# Altium schematic symbol library FPGA_Xilinx_Virtex7.SchLib: 34 symbols (part 33 of 34) (continued)
## XC7VX1140T-FLG1928 (continued)
part S pins: AA12 DONE_0 (io), AB13 PROGRAM_B_0 (io), AB22 VREFN_0 (io), AB23 VP_0 (io), AB33 CCLK_0 (io), AC12 CFGBVS_0 (io), AC22 VN_0 (io), AC23 VREFP_0 (io), AD22 DXN_0 (io), AD23 DXP_0 (io), AD33 TDO_0 (io), AE12 M2_0 (io), AE32 TCK_0 (io), AF13 M1_0 (io), AF33 TMS_0 (io), AG12 M0_0 (io), AG32 TDI_0 (io), V33 VCCO_0 (power), W12 INIT_B_0 (io), Y33 VCCO_0 (power)
part T pins: A3 GND (power), A4 GND (power), A7 GND (power), A8 GND (power), A11 GND (power), A12 GND (power), A13 GND (power), A22 GND (power), A32 GND (power), A33 GND (power), A34 GND (power), A37 GND (power), A38 GND (power), A41 GND (power), A42 GND (power), AA13 VCCINT (power), AA15 VCCINT (power), AA17 VCCINT (power), AA19 VCCAUX_IO_G3 (power), AA21 VCCINT (power), AA22 GNDADC (power), AA23 VCCADC (power), AA25 VCCBRAM (power), AA27 VCCAUX (power), AA29 VCCINT (power), AA31 VCCINT (power), AA32 VCCBATT_0 (power), AA33 VCCINT (power), AB12 VCCINT (power), AB14 VCCINT (power), AB16 VCCINT (power), AB18 VCCAUX (power), AB20 VCCINT (power), AB24 VCCBRAM (power), AB26 VCCBRAM (power), AB28 VCCINT (power), AB30 VCCINT (power), AB32 VCCINT (power), AC13 VCCINT (power), AC15 VCCINT (power), AC17 VCCINT (power), AC19 VCCAUX_IO_G2 (power), AC21 VCCINT (power), AC25 VCCBRAM (power), AC27 VCCAUX (power), AC29 VCCINT (power), AC31 VCCINT (power), AC33 VCCINT (power), AD12 VCCINT (power), AD14 VCCINT (power), AD16 VCCINT (power), AD18 VCCAUX (power), AD20 VCCINT (power), AD24 VCCBRAM (power), AD26 VCCAUX_IO_G0 (power), AD28 VCCINT (power), AD30 VCCINT (power), AD32 VCCINT (power), AE13 VCCINT (power), AE15 VCCINT (power), AE17 VCCINT (power), AE19 VCCAUX_IO_G2 (power), AE21 VCCINT (power), AE23 VCCINT (power), AE25 VCCBRAM (power), AE27 VCCAUX (power), AE29 VCCINT (power), AE31 VCCINT (power), AE33 VCCINT (power), AF12 VCCINT (power), AF14 VCCINT (power), AF16 VCCINT (power), AF18 VCCAUX (power), AF20 VCCINT (power), AF22 VCCINT (power), AF24 VCCINT (power), AF26 VCCAUX_IO_G0 (power), AF28 VCCINT (power), AF30 VCCINT (power), AF32 VCCINT (power), AG13 VCCINT (power), AG15 VCCINT (power), AG17 VCCINT (power), AG19 VCCAUX_IO_G2 (power), AG21 VCCINT (power), AG23 VCCINT (power), AG25 VCCBRAM (power), AG27 VCCINT (power), AG29 VCCINT (power), AG31 VCCINT (power), AG33 VCCINT (power), AH12 VCCINT (power), AH32 VCCINT (power), B2 GND (power), B5 GND (power), B9 GND (power), B13 GND (power), B19 GND (power), B29 GND (power), B32 GND (power), B36 GND (power), B40 GND (power), B43 GND (power), C3 GND (power), C7 GND (power), C11 GND (power), C13 GND (power), C16 GND (power), C26 GND (power), C32 GND (power), C34 GND (power), C38 GND (power), C42 GND (power), D1 GND (power), D5 GND (power), D6 GND (power), D9 GND (power), D10 GND (power), D13 GND (power), D23 GND (power), D32 GND (power), D35 GND (power), D36 GND (power), D39 GND (power), D40 GND (power), D44 GND (power), E3 GND (power), E7 GND (power), E11 GND (power), E12 GND (power), E13 GND (power), E20 GND (power), E30 GND (power), E32 GND (power), E33 GND (power), E34 GND (power), E38 GND (power), E42 GND (power), F1 GND (power), F2 GND (power), F5 GND (power), F9 GND (power), F13 GND (power), F17 GND (power), F27 GND (power), F32 GND (power), F36 GND (power), F40 GND (power), F43 GND (power), F44 GND (power), G3 GND (power), G4 GND (power), G7 GND (power), G8 GND (power), G11 GND (power), G12 GND (power), G13 GND (power), G14 GND (power), G24 GND (power), G32 GND (power), G33 GND (power), G34 GND (power), G37 GND (power), G38 GND (power), G41 GND (power), G42 GND (power), H1 GND (power), H5 GND (power), H6 GND (power), H9 GND (power), H10 GND (power), H13 GND (power), H21 GND (power), H31 GND (power), H32 GND (power), H35 GND (power), H36 GND (power), H39 GND (power), U15 VCCINT (power), U17 VCCINT (power), U19 VCCAUX_IO_G3 (power), U21 VCCINT (power), U23 VCCINT (power), U25 VCCBRAM (power), U27 VCCAUX (power), U29 VCCINT (power), U31 VCCINT (power), V12 VCCINT (power), V14 VCCINT (power), V16 VCCINT (power), V18 VCCAUX (power), V20 VCCINT (power), V22 VCCINT (power), V24 VCCINT (power), V26 VCCAUX_IO_G1 (power), V28 VCCINT (power), V30 VCCINT (power), V32 VCCINT (power), W13 VCCINT (power), W15 VCCINT (power), W17 VCCINT (power), W19 VCCAUX_IO_G3 (power), W21 VCCINT (power), W23 VCCINT (power), W25 VCCBRAM (power), W27 VCCAUX (power), W29 VCCINT (power), W31 VCCINT (power), W33 VCCINT (power), Y12 VCCINT (power), Y14 VCCINT (power), Y16 VCCINT (power), Y18 VCCAUX (power), Y20 VCCINT (power), Y22 VCCINT (power), Y24 VCCBRAM (power), Y26 VCCAUX_IO_G0 (power), Y28 VCCINT (power), Y30 VCCINT (power), Y32 VCCINT (power)
part U pins: AA3 GND (power), AA7 GND (power), AA11 GND (power), AA14 GND (power), AA16 GND (power), AA18 GND (power), AA20 GND (power), AA24 GND (power), AA26 GND (power), AA28 GND (power), AA30 GND (power), AA34 GND (power), AA38 GND (power), AA42 GND (power), AB1 GND (power), AB5 GND (power), AB6 GND (power), AB9 GND (power), AB11 GND (power), AB15 GND (power), AB17 GND (power), AB19 GND (power), AB21 GND (power), AB25 GND (power), AB27 GND (power), AB29 GND (power), AB31 GND (power), AB34 GND (power), AB36 GND (power), AB39 GND (power), AB40 GND (power), AB44 GND (power), AC3 GND (power), AC7 GND (power), AC8 GND (power), AC11 GND (power), AC14 GND (power), AC16 GND (power), AC18 GND (power), AC20 GND (power), AC24 GND (power), AC26 GND (power), AC28 GND (power), AC30 GND (power), AC32 GND (power), AC34 GND (power), AC37 GND (power), AC38 GND (power), AC42 GND (power), AD1 GND (power), AD5 GND (power), AD9 GND (power), AD11 GND (power), AD13 GND (power), AD15 GND (power), AD17 GND (power), AD19 GND (power), AD21 GND (power), AD25 GND (power), AD27 GND (power), AD29 GND (power), AD31 GND (power), AD34 GND (power), AD36 GND (power), AD40 GND (power), AD44 GND (power), AE3 GND (power), AE7 GND (power), AE11 GND (power), AE14 GND (power), AE16 GND (power), AE18 GND (power), AE20 GND (power), AE22 GND (power), AE24 GND (power), AE26 GND (power), AE28 GND (power), AE30 GND (power), AE34 GND (power), AE38 GND (power), AE42 GND (power), AF1 GND (power), AF2 GND (power), AF5 GND (power), AF6 GND (power), AF9 GND (power), AF11 GND (power), AF15 GND (power), AF17 GND (power), AF19 GND (power), AF21 GND (power), AF23 GND (power), AF25 GND (power), AF27 GND (power), AF29 GND (power), AF31 GND (power), AF34 GND (power), AF36 GND (power), AF39 GND (power), AF40 GND (power), AF43 GND (power), AF44 GND (power), AG3 GND (power), AG4 GND (power), AG7 GND (power), AG8 GND (power), AG11 GND (power), AG14 GND (power), AG18 GND (power), AG24 GND (power), AG26 GND (power), AG34 GND (power), AG37 GND (power), AG38 GND (power), AG41 GND (power), AG42 GND (power), AH1 GND (power), AH5 GND (power), AH9 GND (power), AH10 GND (power), H40 GND (power), H44 GND (power), J3 GND (power), J7 GND (power), J11 GND (power), J12 GND (power), J13 GND (power), J18 GND (power), J28 GND (power), J32 GND (power), J33 GND (power), J34 GND (power), J38 GND (power), J42 GND (power), K1 GND (power), K5 GND (power), K9 GND (power), K13 GND (power), K15 GND (power), K25 GND (power), K32 GND (power), K36 GND (power), K40 GND (power), K44 GND (power), L3 GND (power), L7 GND (power), L8 GND (power), L12 GND (power), L13 GND (power), L22 GND (power), L32 GND (power), L33 GND (power), L37 GND (power), L38 GND (power), L42 GND (power), M1 GND (power), M5 GND (power), M9 GND (power), M10 GND (power), M13 GND (power), M19 GND (power), M29 GND (power), M32 GND (power), M35 GND (power), M36 GND (power), M40 GND (power), M44 GND (power), N3 GND (power), N7 GND (power), N11 GND (power), N12 GND (power), N13 GND (power), N16 GND (power), N26 GND (power), N32 GND (power), N33 GND (power), N34 GND (power), N38 GND (power), N42 GND (power), P1 GND (power), P2 GND (power), P5 GND (power), P6 GND (power), P9 GND (power), P13 GND (power), P23 GND (power), P32 GND (power), P36 GND (power), P39 GND (power), P40 GND (power), P43 GND (power), P44 GND (power), R3 GND (power), R4 GND (power), R7 GND (power), R8 GND (power), R11 GND (power), R12 GND (power), R13 GND (power), R20 GND (power), R30 GND (power), R32 GND (power), R33 GND (power), R34 GND (power), R37 GND (power), R38 GND (power), R41 GND (power), R42 GND (power), T1 GND (power), T5 GND (power), T9 GND (power), T10 GND (power), T13 GND (power), T17 GND (power), T27 GND (power), T31 GND (power), T32 GND (power), T35 GND (power), T36 GND (power), T40 GND (power), T44 GND (power), U3 GND (power), U7 GND (power), U11 GND (power), U12 GND (power), U13 GND (power), U14 GND (power), U16 GND (power), U18 GND (power), U20 GND (power), U22 GND (power), U24 GND (power), U26 GND (power), U28 GND (power), U30 GND (power), U32 GND (power), U33 GND (power), U34 GND (power), U38 GND (power), U42 GND (power), V1 GND (power), V2 GND (power), V5 GND (power), V6 GND (power), V9 GND (power), V10 GND (power), V11 GND (power), V13 GND (power), V15 GND (power), V17 GND (power), V19 GND (power), V21 GND (power), V23 GND (power), V25 GND (power), V27 GND (power), V29 GND (power), V31 GND (power), V34 GND (power), V35 GND (power), V36 GND (power), V39 GND (power), V40 GND (power), V43 GND (power), V44 GND (power), W3 GND (power), W4 GND (power), W7 GND (power), W8 GND (power), W11 GND (power), W14 GND (power), W16 GND (power), W18 GND (power), W20 GND (power), W22 GND (power), W24 GND (power), W26 GND (power), W28 GND (power), W30 GND (power), W32 GND (power), W34 GND (power), W37 GND (power), W38 GND (power), W41 GND (power), W42 GND (power), Y1 GND (power), Y5 GND (power), Y9 GND (power), Y11 GND (power), Y13 GND (power), Y15 GND (power), Y17 GND (power), Y19 GND (power), Y21 GND (power), Y23 GND (power), Y25 GND (power), Y27 GND (power), Y29 GND (power), Y31 GND (power), Y34 GND (power), Y36 GND (power), Y40 GND (power), Y44 GND (power)
part V pins: AH11 GND (power), AH13 GND (power), AH21 GND (power), AH31 GND (power), AH33 GND (power), AH34 GND (power), AH35 GND (power), AH36 GND (power), AH40 GND (power), AH44 GND (power), AJ3 GND (power), AJ7 GND (power), AJ11 GND (power), AJ12 GND (power), AJ13 GND (power), AJ18 GND (power), AJ28 GND (power), AJ32 GND (power), AJ33 GND (power), AJ34 GND (power), AJ38 GND (power), AJ42 GND (power), AK1 GND (power), AK2 GND (power), AK5 GND (power), AK6 GND (power), AK9 GND (power), AK10 GND (power), AK13 GND (power), AK15 GND (power), AK25 GND (power), AK32 GND (power), AK35 GND (power), AK36 GND (power), AK39 GND (power), AK40 GND (power), AK43 GND (power), AK44 GND (power), AL3 GND (power), AL4 GND (power), AL7 GND (power), AL8 GND (power), AL11 GND (power), AL12 GND (power), AL13 GND (power), AL22 GND (power), AL32 GND (power), AL33 GND (power), AL34 GND (power), AL37 GND (power), AL38 GND (power), AL41 GND (power), AL42 GND (power), AM1 GND (power), AM5 GND (power), AM9 GND (power), AM13 GND (power), AM19 GND (power), AM29 GND (power), AM32 GND (power), AM36 GND (power), AM40 GND (power), AM44 GND (power), AN3 GND (power), AN7 GND (power), AN11 GND (power), AN12 GND (power), AN13 GND (power), AN16 GND (power), AN26 GND (power), AN32 GND (power), AN33 GND (power), AN34 GND (power), AN38 GND (power), AN42 GND (power), AP1 GND (power), AP5 GND (power), AP6 GND (power), AP9 GND (power), AP10 GND (power), AP13 GND (power), AP23 GND (power), AP32 GND (power), AP35 GND (power), AP36 GND (power), AP39 GND (power), AP40 GND (power), AP44 GND (power), AR3 GND (power), AR7 GND (power), AR12 GND (power), AR13 GND (power), AR20 GND (power), AR30 GND (power), AR32 GND (power), AR33 GND (power), AR38 GND (power), AR42 GND (power), AT1 GND (power), AT5 GND (power), AT9 GND (power), AT10 GND (power), AT13 GND (power), AT17 GND (power), AT27 GND (power), AT32 GND (power), AT35 GND (power), AT36 GND (power), AT40 GND (power), AT44 GND (power), AU3 GND (power), AU4 GND (power), AU7 GND (power), AU8 GND (power), AU11 GND (power), AU12 GND (power), AU13 GND (power), AU14 GND (power), AU24 GND (power), AU32 GND (power), AU33 GND (power), AU34 GND (power), AU37 GND (power), AU38 GND (power), AU41 GND (power), AU42 GND (power), AV1 GND (power), AV5 GND (power), AV9 GND (power), AV13 GND (power), AV21 GND (power), AV31 GND (power), AV32 GND (power), AV36 GND (power), AV40 GND (power), AV44 GND (power), AW3 GND (power), AW7 GND (power), AW11 GND (power), AW12 GND (power), AW13 GND (power), AW18 GND (power), AW28 GND (power), AW32 GND (power), AW33 GND (power), AW34 GND (power), AW38 GND (power), AW42 GND (power), AY1 GND (power), AY2 GND (power), AY5 GND (power), AY6 GND (power), AY9 GND (power), AY10 GND (power), AY13 GND (power), AY15 GND (power), AY25 GND (power), AY32 GND (power), AY35 GND (power), AY36 GND (power), AY39 GND (power), AY40 GND (power), AY43 GND (power), AY44 GND (power), BA3 GND (power), BA4 GND (power), BA7 GND (power), BA11 GND (power), BA12 GND (power), BA13 GND (power), BA22 GND (power), BA32 GND (power), BA33 GND (power), BA34 GND (power), BA38 GND (power), BA41 GND (power), BA42 GND (power), BB1 GND (power), BB5 GND (power), BB9 GND (power), BB13 GND (power), BB19 GND (power), BB29 GND (power), BB32 GND (power), BB36 GND (power), BB40 GND (power), BB44 GND (power), BC2 GND (power), BC3 GND (power), BC7 GND (power), BC11 GND (power), BC13 GND (power), BC16 GND (power), BC26 GND (power), BC32 GND (power), BC34 GND (power), BC38 GND (power), BC42 GND (power), BC43 GND (power), BD5 GND (power), BD6 GND (power), BD9 GND (power), BD10 GND (power), BD13 GND (power), BD23 GND (power), BD32 GND (power), BD35 GND (power), BD36 GND (power), BD39 GND (power), BD40 GND (power)

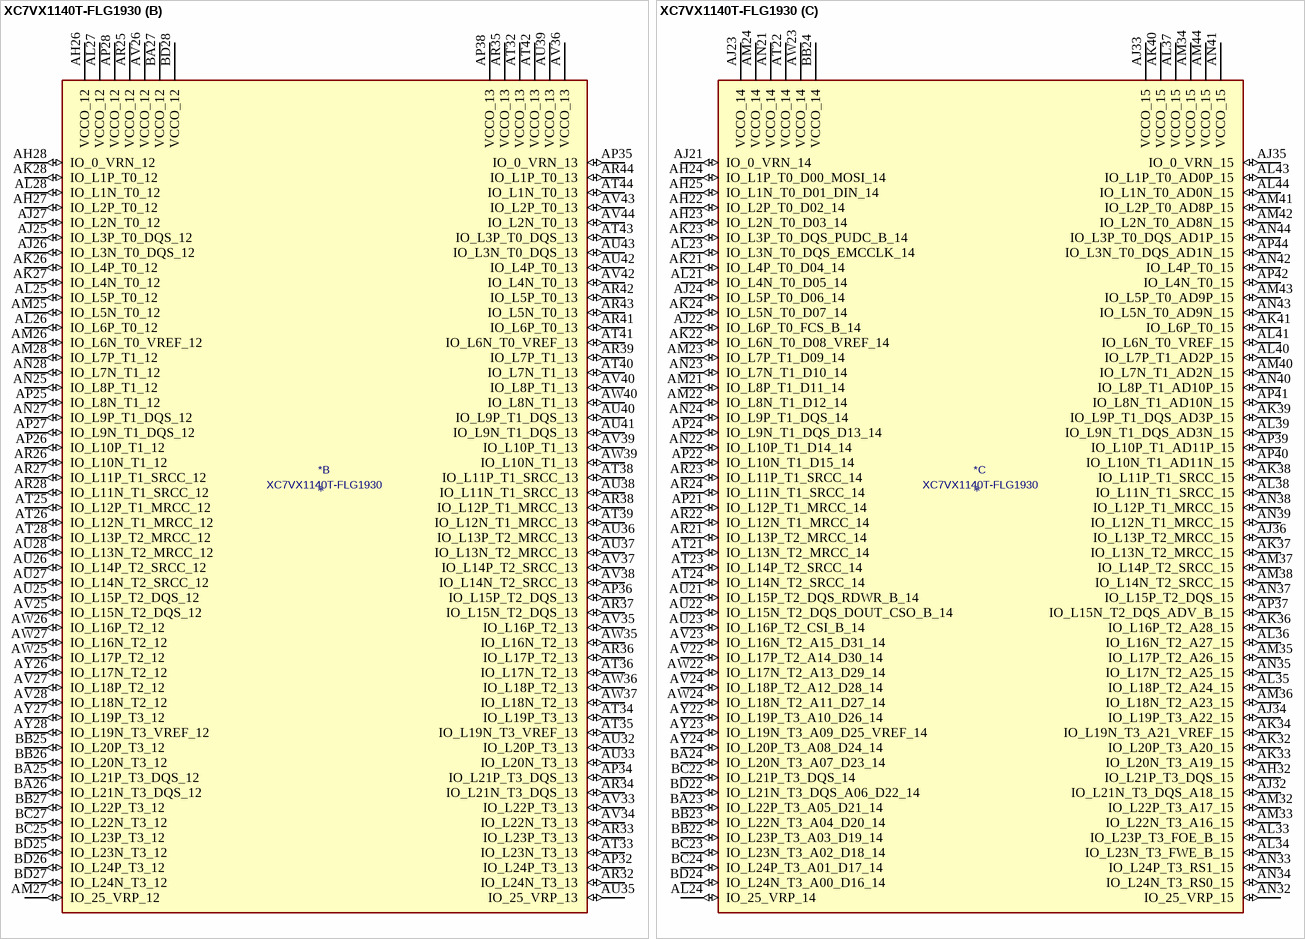
[diagram p167: symbol XC7VX1140T-FLG1930]

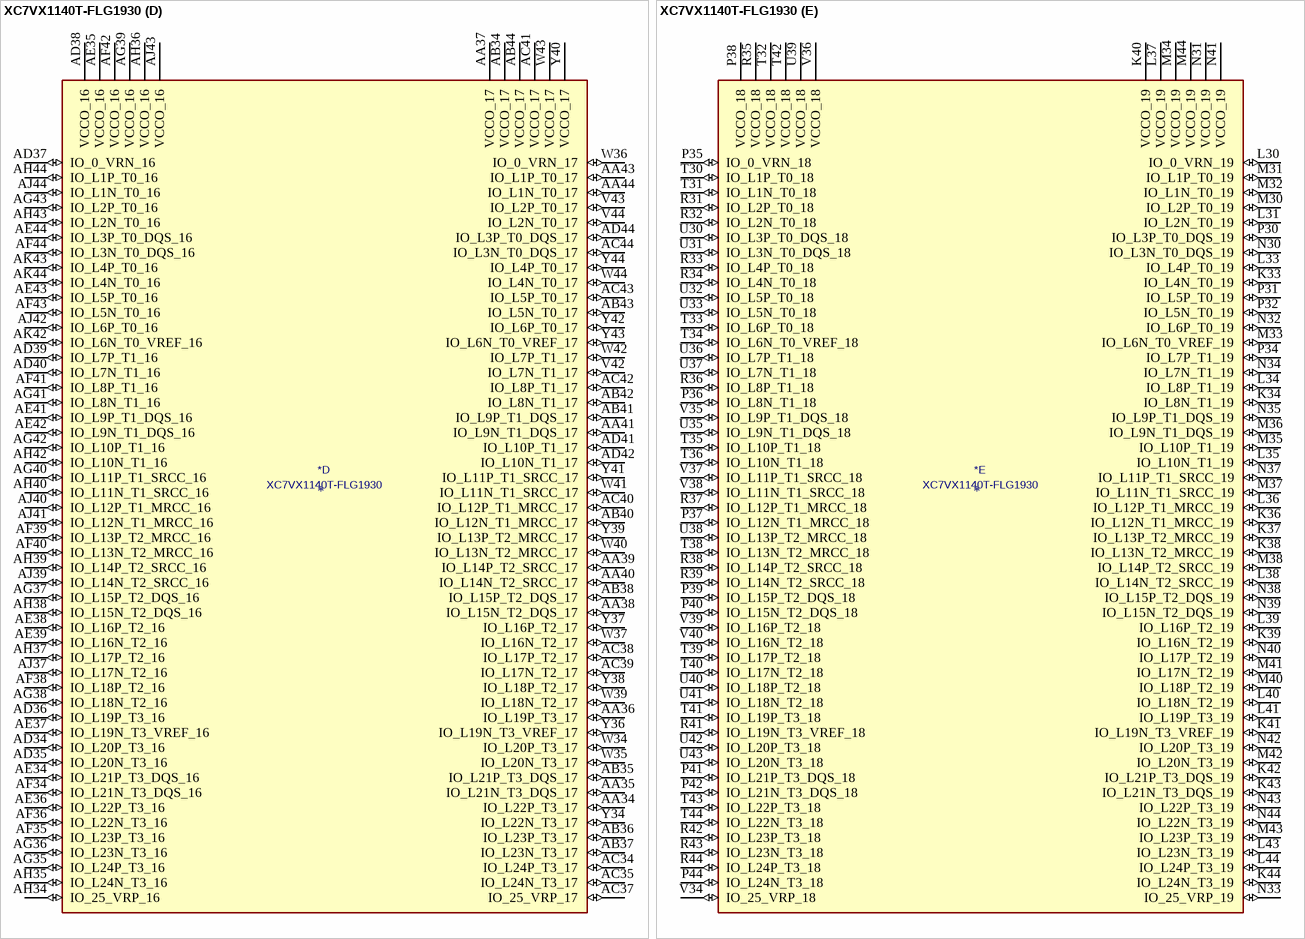
[diagram p168: symbol XC7VX1140T-FLG1930]

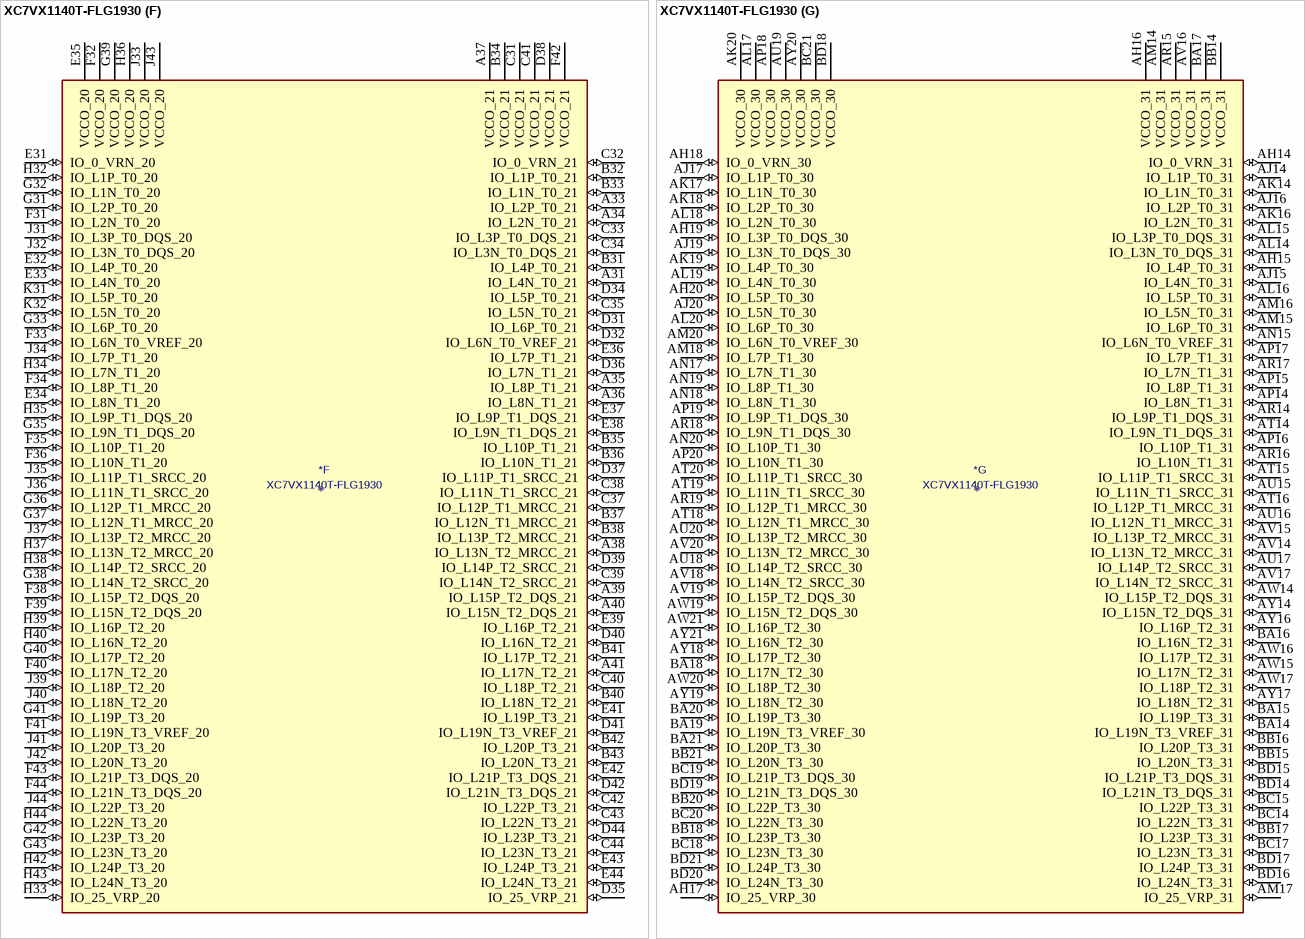
[diagram p169: symbol XC7VX1140T-FLG1930]

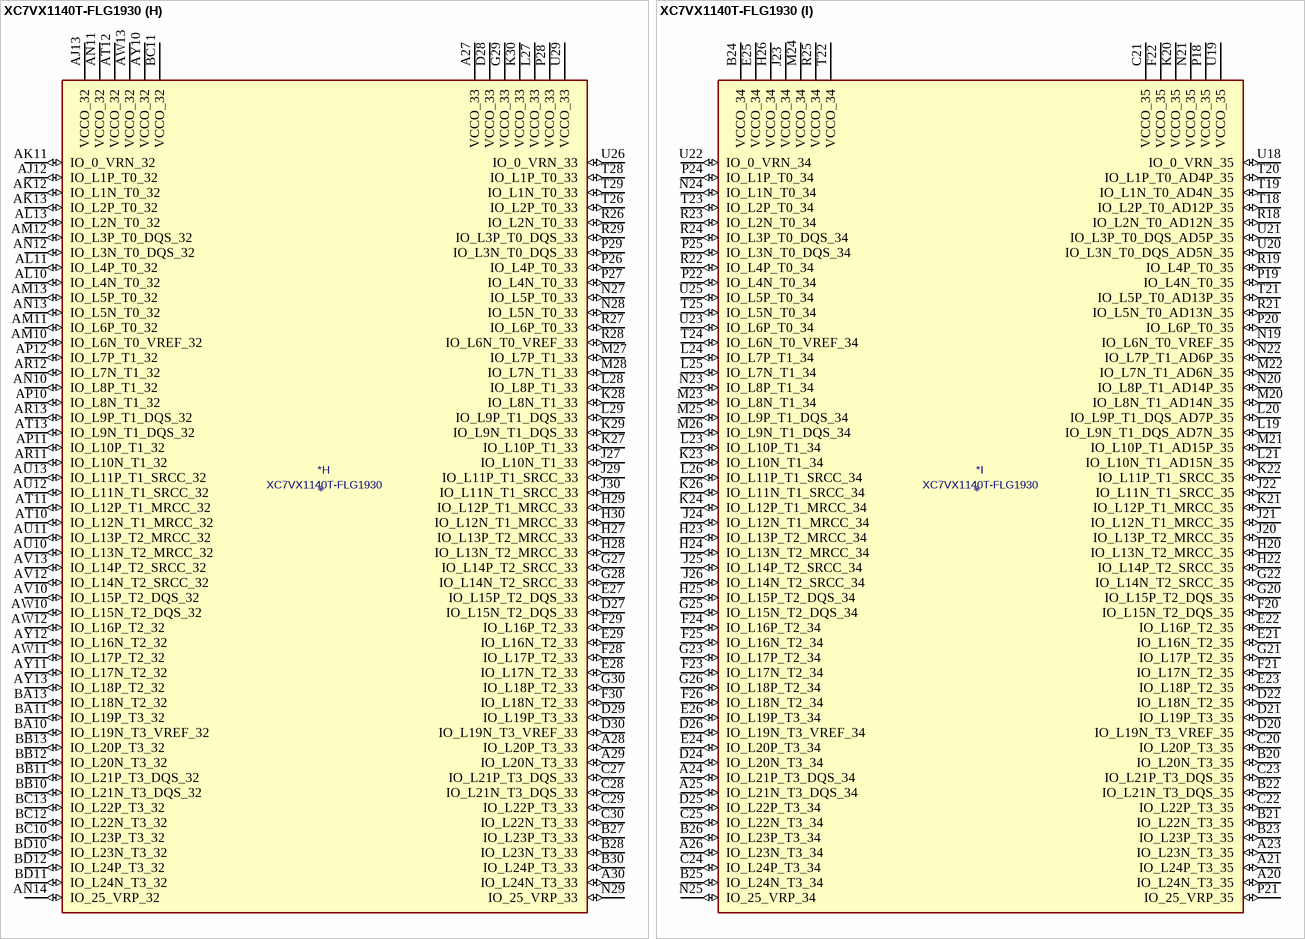
[diagram p170: symbol XC7VX1140T-FLG1930]

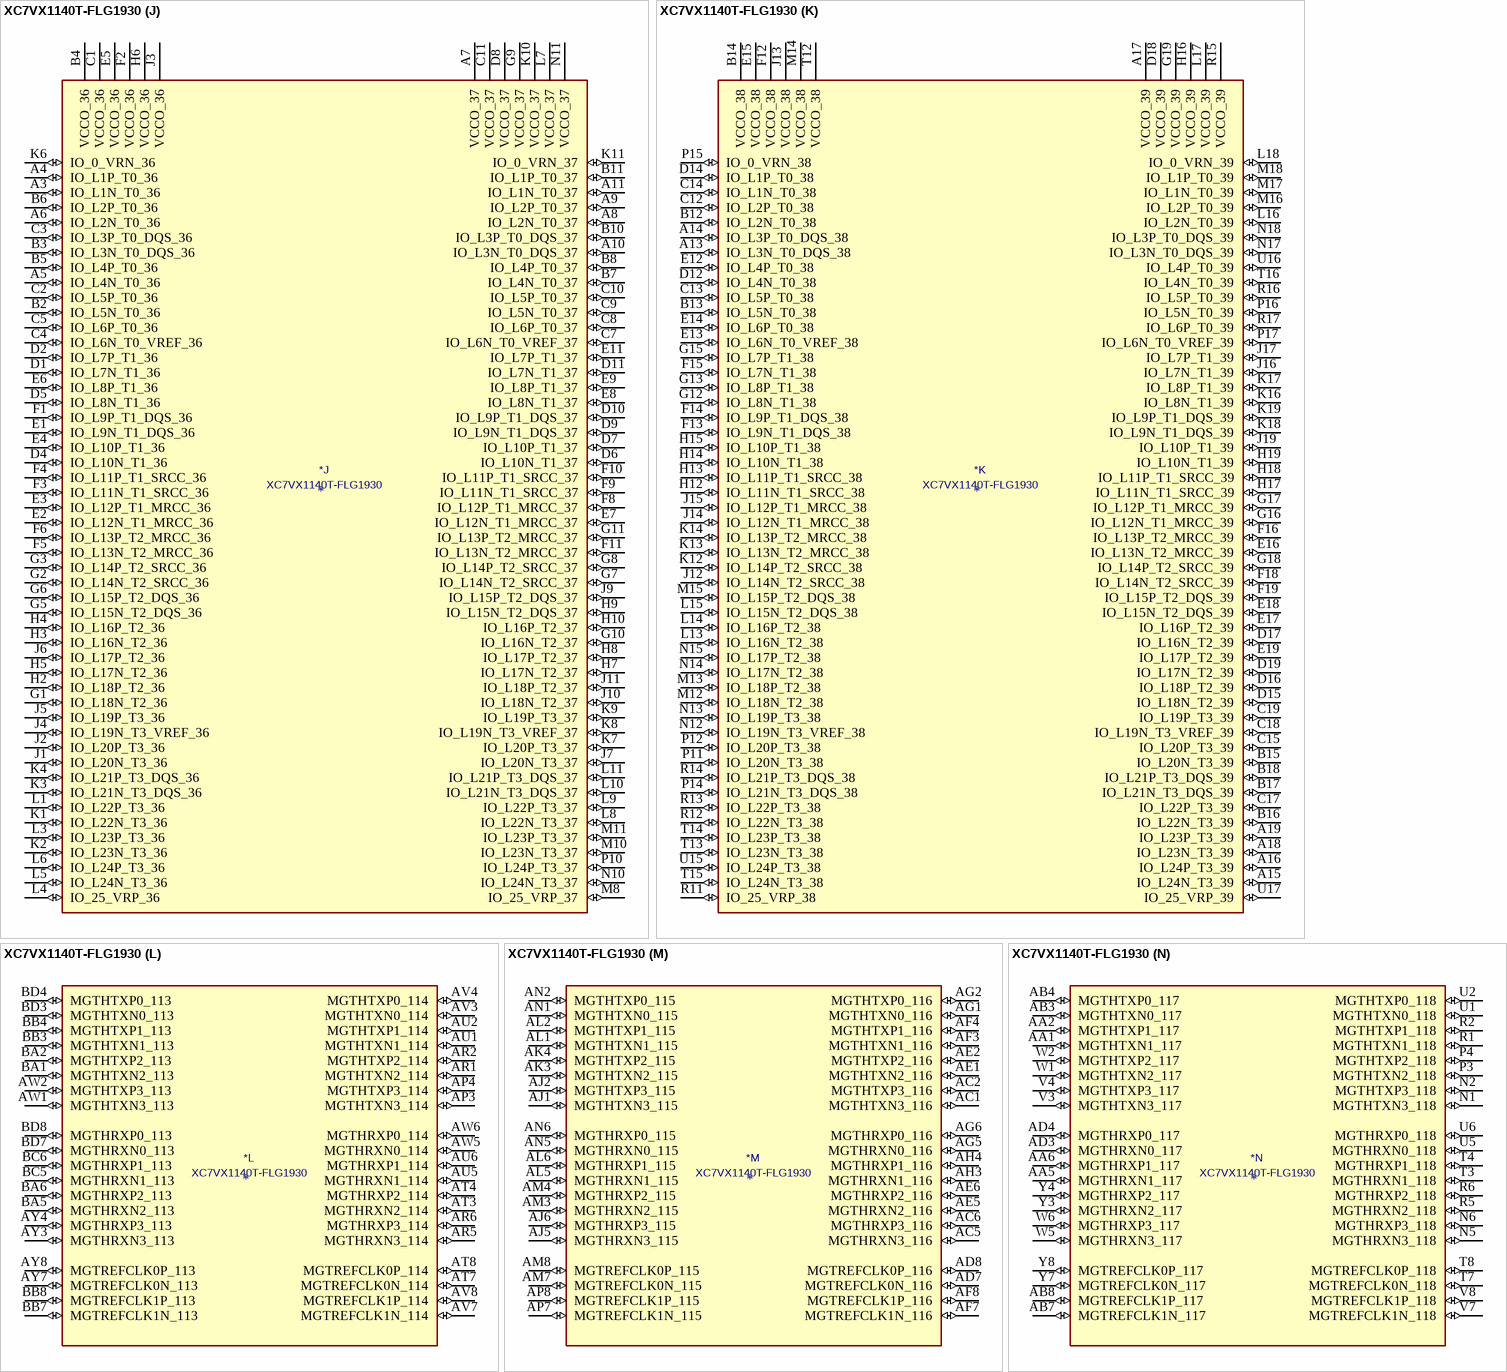
[diagram p171: symbol XC7VX1140T-FLG1930]

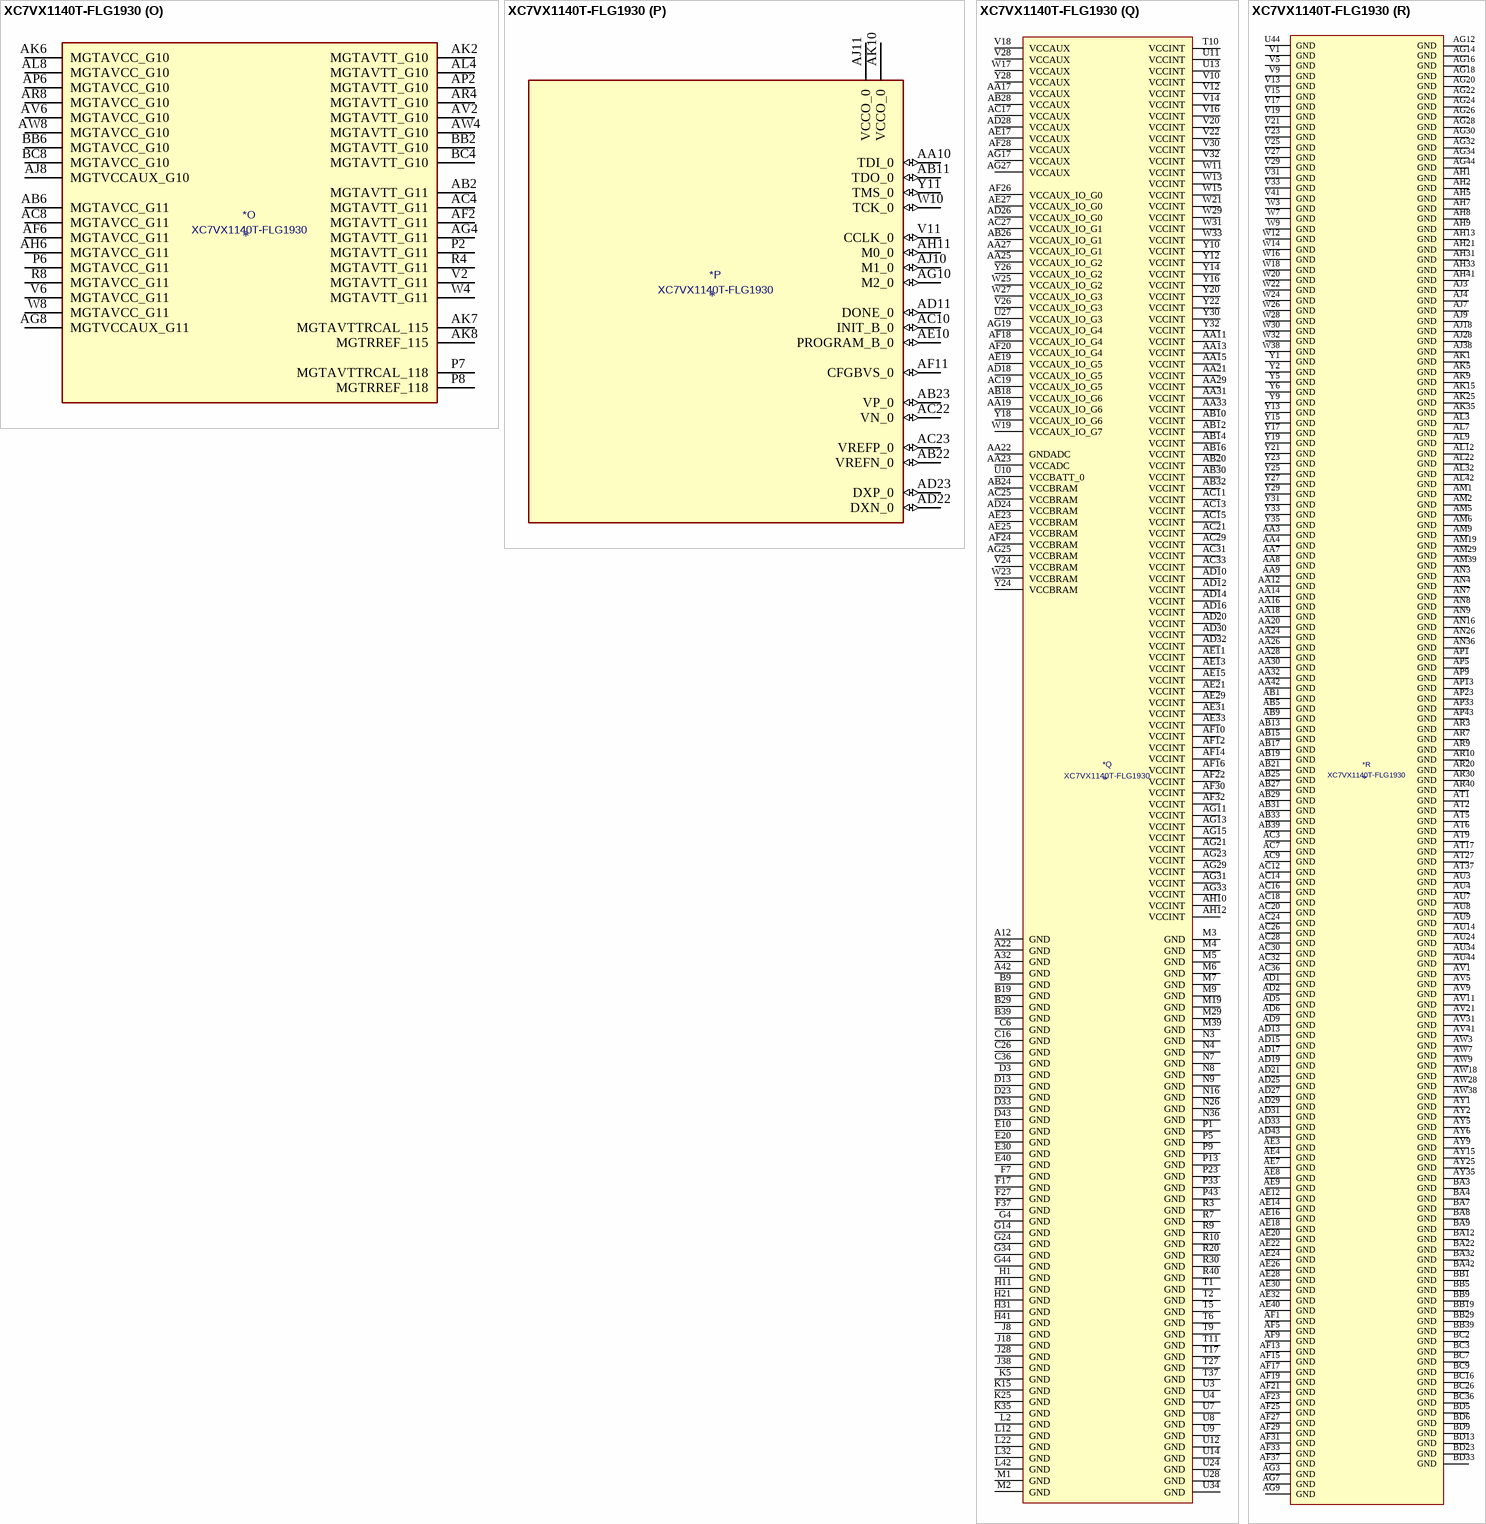
[diagram p172: symbol XC7VX1140T-FLG1930]